# Altium footprint library 2.54-华普微电子模块.PcbLib: 59 footprints (part 3 of 4)
Each footprint in its own frame and in the unit in brackets; x right, y up, seen from the top. Pads: shape width x height; smd on the part's side, far side on the other; paste and mask are expansions set on the pad; w line width, h text height; cw(c..) or ccw(c..) is an arc to the next point about the centre after c.
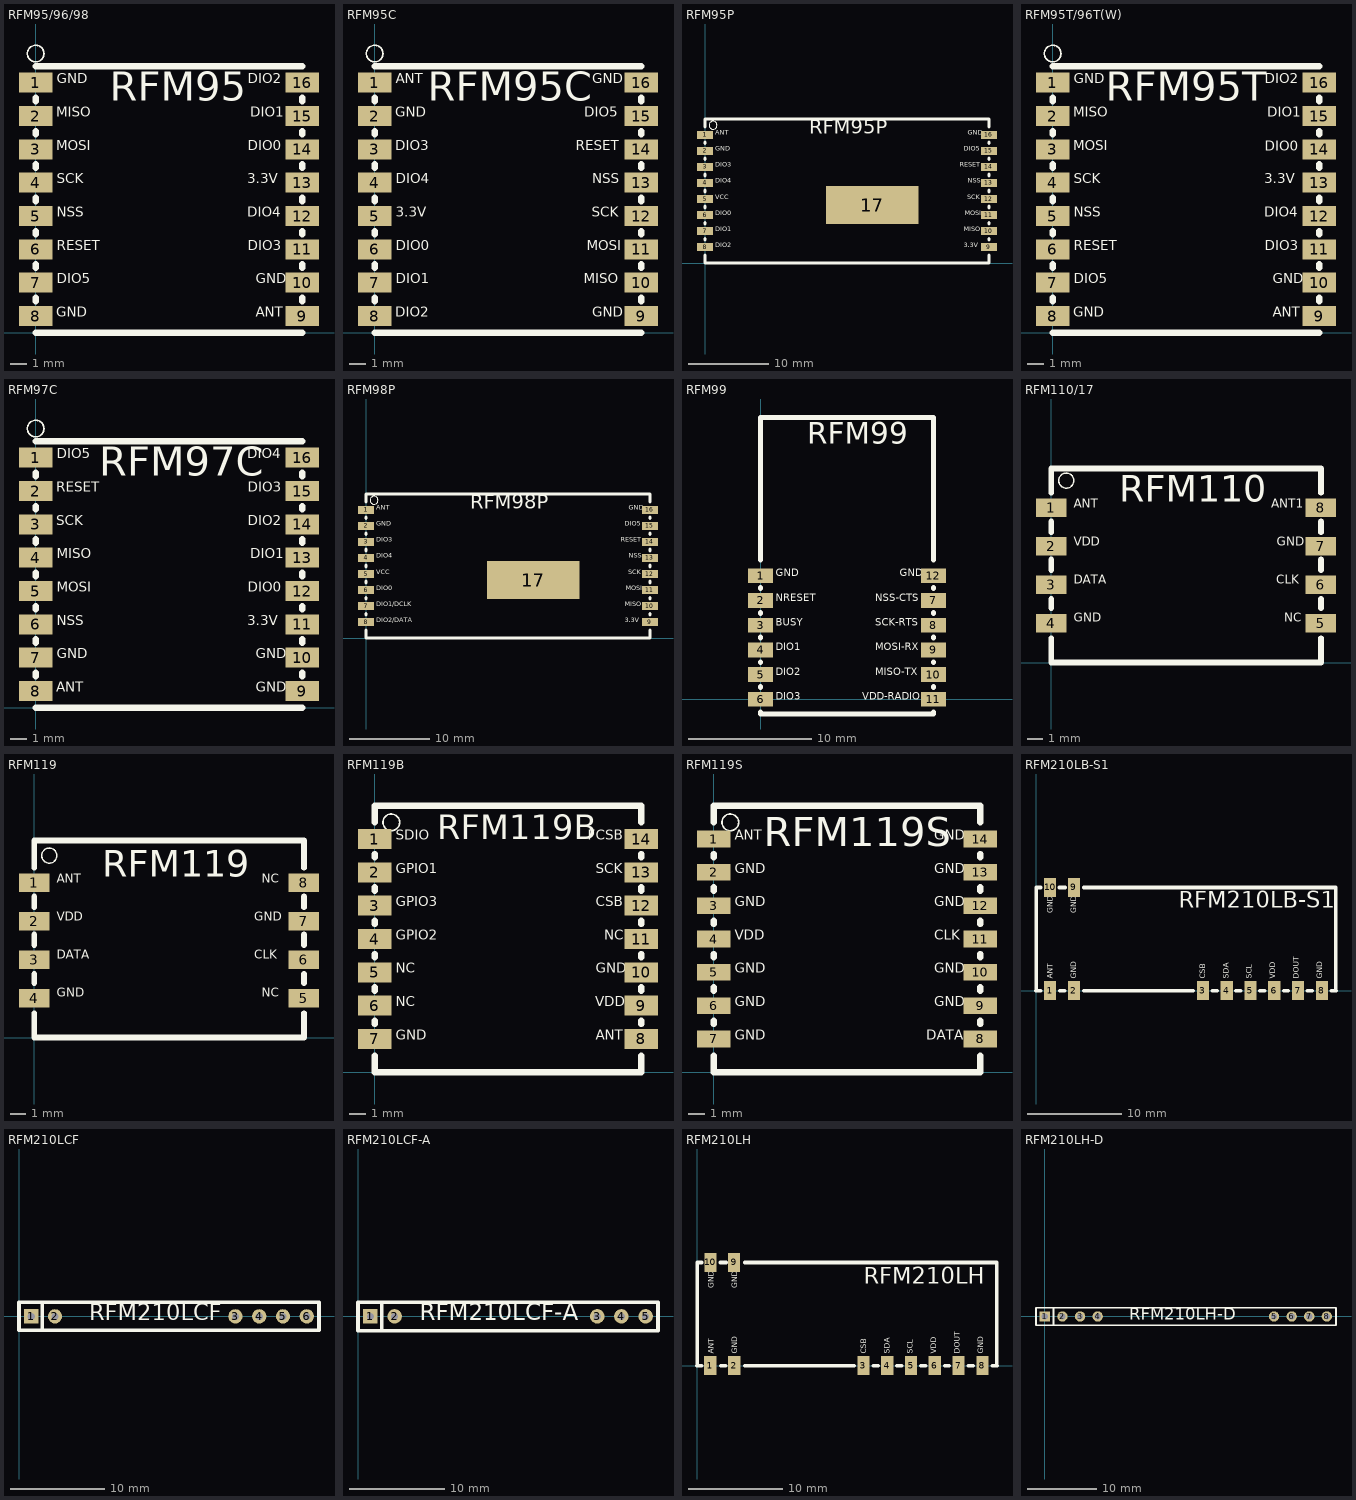
[diagram p2: the footprints below, top view; thin cyan lines are the x and y axes]

## RFM95/96/98 [mm]
pads (16):
  rect 2x1.2 smd: 1(0,15) 2(0,13) 3(0,11) 4(0,9) 5(0,7) 6(0,5) 7(0,3) 8(0,1) 9(16,1) 10(16,3) 11(16,5) 12(16,7) 13(16,9) 14(16,11) 15(16,13) 16(16,15)
Top Overlay:
  circle w0.1: c0,16.75 r0.5
  lines w0.381: 0,0 16,0 ; 0,1.9 0,2.1 ; 0,3.9 0,4.1 ; 0,5.9 0,6.1 ; 0,7.9 0,8.1 ; 0,9.9 0,10.1 ; 0,11.9 0,12.1 ; 0,13.9 0,14.1 ; 0,16 16,16 ; 16,1.9 16,2.1 ; 16,3.9 16,4.1 ; 16,5.9 16,6.1 ; 16,7.9 16,8.1 ; 16,9.9 16,10.1 ; 16,11.9 16,12.1 ; 16,13.9 16,14.1
  text "RFM95" at 4.445,13.335 h3
  text "GND" at 1.25,14.75 h1
  text "MISO" at 1.249,12.75 h1
  text "MOSI" at 1.249,10.75 h1
  text "SCK" at 1.25,8.75 h1
  text "GND" at 1.249,0.75 h1
  text "DIO5" at 1.25,2.75 h1
  text "RESET" at 1.25,4.75 h1
  text "NSS" at 1.25,6.75 h1
  text "3.3V" at 12.7,8.75 h1
  text "DIO0" at 12.731,10.75 h1
  text "DIO1" at 12.883,12.75 h1
  text "DIO2" at 12.739,14.75 h1
  text "DIO4" at 12.7,6.75 h1
  text "DIO3" at 12.739,4.75 h1
  text "GND" at 13.215,2.75 h1
  text "ANT" at 13.204,0.75 h1

## RFM95C [mm]
pads (16):
  rect 2x1.2 smd: 1(0,15) 2(0,13) 3(0,11) 4(0,9) 5(0,7) 6(0,5) 7(0,3) 8(0,1) 9(16,1) 10(16,3) 11(16,5) 12(16,7) 13(16,9) 14(16,11) 15(16,13) 16(16,15)
Top Overlay:
  circle w0.1: c0,16.75 r0.5
  lines w0.381: 0,0 16,0 ; 0,1.9 0,2.1 ; 0,3.9 0,4.1 ; 0,5.9 0,6.1 ; 0,7.9 0,8.1 ; 0,9.9 0,10.1 ; 0,11.9 0,12.1 ; 0,13.9 0,14.1 ; 0,16 16,16 ; 16,1.9 16,2.1 ; 16,3.9 16,4.1 ; 16,5.9 16,6.1 ; 16,7.9 16,8.1 ; 16,9.9 16,10.1 ; 16,11.9 16,12.1 ; 16,13.9 16,14.1
  text "GND" at 13.044,0.75 h1
  text "MISO" at 12.541,2.75 h1
  text "MOSI" at 12.712,4.75 h1
  text "SCK" at 13.025,6.75 h1
  text "GND" at 13.044,14.75 h1
  text "DIO5" at 12.566,12.75 h1
  text "RESET" at 12.065,10.75 h1
  text "NSS" at 13.052,8.75 h1
  text "3.3V" at 1.25,6.75 h1
  text "DIO0" at 1.25,4.75 h1
  text "DIO1" at 1.25,2.75 h1
  text "DIO2" at 1.249,0.75 h1
  text "DIO4" at 1.25,8.75 h1
  text "DIO3" at 1.249,10.75 h1
  text "GND" at 1.249,12.75 h1
  text "ANT" at 1.25,14.75 h1
  text "RFM95C" at 3.175,13.335 h3

## RFM95P [mm]
pads (17):
  rect 2x1 smd: 1(0,16) 2(0,14) 3(0,12) 4(0,10) 5(0,8) 6(0,6) 7(0,4) 8(0,2) 9(35.4,2) 10(35.4,4) 11(35.4,6) 12(35.4,8) 13(35.4,10) 14(35.4,12) 15(35.4,14) 16(35.4,16)
  rect 11.5x4.7 smd: 17(20.85,7.25)
Top Overlay:
  circle w0.1: c1,17.2 r0.5
  lines w0.381: 0,1 0,0 35.4,0 35.4,1 ; 0,2.9 0,3.1 ; 0,4.9 0,5.1 ; 0,6.9 0,7.1 ; 0,8.9 0,9.1 ; 0,10.9 0,11.1 ; 0,12.9 0,13.1 ; 0,14.9 0,15.1 ; 0,17 0,18 35.4,18 35.4,17 ; 35.4,2.9 35.4,3.1 ; 35.4,4.9 35.4,5.1 ; 35.4,6.9 35.4,7.1 ; 35.4,8.9 35.4,9.1 ; 35.4,10.9 35.4,11.1 ; 35.4,12.9 35.4,13.1 ; 35.4,14.9 35.4,15.1
  text "VCC" at 1.25,7.75 h1
  text "DIO0" at 1.25,5.75 h1
  text "DIO1" at 1.25,3.75 h1
  text "DIO2" at 1.249,1.75 h1
  text "DIO4" at 1.25,9.75 h1
  text "DIO3" at 1.249,11.75 h1
  text "GND" at 1.249,13.75 h1
  text "ANT" at 1.25,15.75 h1
  text "SCK" at 32.709,7.75 h1
  text "MOSI" at 32.396,5.75 h1
  text "MISO" at 32.225,3.75 h1
  text "3.3V" at 32.24,1.75 h1
  text "NSS" at 32.736,9.75 h1
  text "RESET" at 31.749,11.75 h1
  text "DIO5" at 32.25,13.75 h1
  text "GND" at 32.728,15.75 h1
  text "RFM95P" at 13,15.5 h3

## RFM95T/96T(W) [mm]
pads (16):
  rect 2x1.2 smd: 1(0,15) 2(0,13) 3(0,11) 4(0,9) 5(0,7) 6(0,5) 7(0,3) 8(0,1) 9(16,1) 10(16,3) 11(16,5) 12(16,7) 13(16,9) 14(16,11) 15(16,13) 16(16,15)
Top Overlay:
  circle w0.1: c0,16.75 r0.5
  lines w0.381: 0,0 16,0 ; 0,1.9 0,2.1 ; 0,3.9 0,4.1 ; 0,5.9 0,6.1 ; 0,7.9 0,8.1 ; 0,9.9 0,10.1 ; 0,11.9 0,12.1 ; 0,13.9 0,14.1 ; 0,16 16,16 ; 16,1.9 16,2.1 ; 16,3.9 16,4.1 ; 16,5.9 16,6.1 ; 16,7.9 16,8.1 ; 16,9.9 16,10.1 ; 16,11.9 16,12.1 ; 16,13.9 16,14.1
  text "RFM95T" at 3.175,13.335 h3
  text "GND" at 1.25,14.75 h1
  text "MISO" at 1.249,12.75 h1
  text "MOSI" at 1.249,10.75 h1
  text "SCK" at 1.25,8.75 h1
  text "GND" at 1.249,0.75 h1
  text "DIO5" at 1.25,2.75 h1
  text "RESET" at 1.25,4.75 h1
  text "NSS" at 1.25,6.75 h1
  text "3.3V" at 12.7,8.75 h1
  text "DIO0" at 12.731,10.7 h1
  text "DIO1" at 12.883,12.75 h1
  text "DIO2" at 12.739,14.75 h1
  text "DIO4" at 12.7,6.75 h1
  text "DIO3" at 12.739,4.75 h1
  text "GND" at 13.215,2.75 h1
  text "ANT" at 13.204,0.75 h1

## RFM97C [mm]
pads (16):
  rect 2x1.2 smd: 1(0,15) 2(0,13) 3(0,11) 4(0,9) 5(0,7) 6(0,5) 7(0,3) 8(0,1) 9(16,1) 10(16,3) 11(16,5) 12(16,7) 13(16,9) 14(16,11) 15(16,13) 16(16,15)
Top Overlay:
  circle w0.1: c0,16.75 r0.5
  lines w0.381: 0,0 16,0 ; 0,1.9 0,2.1 ; 0,3.9 0,4.1 ; 0,5.9 0,6.1 ; 0,7.9 0,8.1 ; 0,9.9 0,10.1 ; 0,11.9 0,12.1 ; 0,13.9 0,14.1 ; 0,16 16,16 ; 16,1.9 16,2.1 ; 16,3.9 16,4.1 ; 16,5.9 16,6.1 ; 16,7.9 16,8.1 ; 16,9.9 16,10.1 ; 16,11.9 16,12.1 ; 16,13.9 16,14.1
  text "GND" at 13.215,0.75 h1
  text "GND" at 13.215,2.75 h1
  text "3.3V" at 12.7,4.75 h1
  text "DIO0" at 12.731,6.75 h1
  text "DIO4" at 12.7,14.75 h1
  text "DIO3" at 12.739,12.75 h1
  text "DIO2" at 12.739,10.75 h1
  text "DIO1" at 12.883,8.75 h1
  text "MOSI" at 1.25,6.75 h1
  text "NSS" at 1.25,4.75 h1
  text "GND" at 1.25,2.75 h1
  text "ANT" at 1.249,0.75 h1
  text "MISO" at 1.25,8.75 h1
  text "SCK" at 1.249,10.75 h1
  text "RESET" at 1.249,12.75 h1
  text "DIO5" at 1.25,14.75 h1
  text "RFM97C" at 3.81,13.335 h3

## RFM98P [mm]
pads (17):
  rect 2x1 smd: 1(0,16) 2(0,14) 3(0,12) 4(0,10) 5(0,8) 6(0,6) 7(0,4) 8(0,2) 9(35.4,2) 10(35.4,4) 11(35.4,6) 12(35.4,8) 13(35.4,10) 14(35.4,12) 15(35.4,14) 16(35.4,16)
  rect 11.5x4.7 smd: 17(20.85,7.25)
Top Overlay:
  circle w0.1: c1,17.2 r0.5
  lines w0.381: 0,1 0,0 35.4,0 35.4,1 ; 0,2.9 0,3.1 ; 0,4.9 0,5.1 ; 0,6.9 0,7.1 ; 0,8.9 0,9.1 ; 0,10.9 0,11.1 ; 0,12.9 0,13.1 ; 0,14.9 0,15.1 ; 0,17 0,18 35.4,18 35.4,17 ; 35.4,2.9 35.4,3.1 ; 35.4,4.9 35.4,5.1 ; 35.4,6.9 35.4,7.1 ; 35.4,8.9 35.4,9.1 ; 35.4,10.9 35.4,11.1 ; 35.4,12.9 35.4,13.1 ; 35.4,14.9 35.4,15.1
  text "VCC" at 1.25,7.75 h1
  text "DIO0" at 1.25,5.75 h1
  text "DIO1/DCLK" at 1.25,3.75 h1
  text "DIO2/DATA" at 1.249,1.75 h1
  text "DIO4" at 1.25,9.75 h1
  text "DIO3" at 1.249,11.75 h1
  text "GND" at 1.249,13.75 h1
  text "ANT" at 1.25,15.75 h1
  text "SCK" at 32.709,7.75 h1
  text "MOSI" at 32.396,5.75 h1
  text "MISO" at 32.225,3.75 h1
  text "3.3V" at 32.24,1.75 h1
  text "NSS" at 32.736,9.75 h1
  text "RESET" at 31.749,11.75 h1
  text "DIO5" at 32.25,13.75 h1
  text "GND" at 32.728,15.75 h1
  text "RFM98P" at 13,15.5 h3

## RFM99 [mm]
pads (12):
  rect 2x1.2 smd: 1(0,10) 2(0,8) 3(0,6) 4(0,4) 5(0,2) 6(0,0) 7(14,8) 8(14,6) 9(14,4) 10(14,2) 11(14,0) 12(14,10)
Top Overlay:
  lines w0.381: 0,-1 0,-1.19 14,-1.19 14,-1 ; 0,0.95 0,1.05 ; 0,2.95 0,3.05 ; 0,4.95 0,5.05 ; 0,6.95 0,7.05 ; 0,8.95 0,9.05 ; 0,11.25 0,22.81 14,22.81 14,11.25 ; 14,0.95 14,1.05 ; 14,2.95 14,3.05 ; 14,4.95 14,5.05 ; 14,6.95 14,7.05 ; 14,8.95 14,9.05
  text "VDD-RADIO" at 8.25,-0.25 h1
  text "MISO-TX" at 9.268,1.75 h1
  text "MOSI-RX" at 9.268,3.75 h1
  text "SCK-RTS" at 9.284,5.75 h1
  text "NSS-CTS" at 9.287,7.75 h1
  text "GND" at 11.277,9.75 h1
  text "DIO3" at 1.25,-0.25 h1
  text "DIO2" at 1.25,1.75 h1
  text "DIO1" at 1.25,3.75 h1
  text "BUSY" at 1.25,5.75 h1
  text "NRESET" at 1.25,7.75 h1
  text "GND" at 1.25,9.75 h1
  text "RFM99" at 3.8,20.1 h3

## RFM110/17 [mm]
pads (8):
  rect 2x1.2 smd: 1(0,10.21) 2(0,7.67) 3(0,5.13) 4(0,2.59) 5(17.78,2.59) 6(17.78,5.13) 7(17.78,7.67) 8(17.78,10.21)
Top Overlay:
  circle w0.1: c1,12 r0.5
  lines w0.381: 0,1.6 0,0 17.8,0 17.8,1.6 ; 0,3.6 0,4.2 ; 0,6.1 0,6.8 ; 0,8.6 0,9.3 ; 0,11.2 0,12.8 17.8,12.8 17.8,11.2 ; 17.8,3.6 17.8,4.2 ; 17.8,6.1 17.8,6.8 ; 17.8,8.6 17.8,9.3
  text "ANT" at 1.5,10 h1
  text "VDD" at 1.499,7.5 h1
  text "DATA" at 1.499,5 h1
  text "GND" at 1.5,2.5 h1
  text "ANT1" at 14.5,10 h1
  text "GND" at 14.862,7.5 h1
  text "CLK" at 14.843,5 h1
  text "NC" at 15.357,2.5 h1
  text "RFM110" at 4.5,10 h3

## RFM119 [mm]
pads (8):
  rect 2x1.2 smd: 1(0,10.21) 2(0,7.67) 3(0,5.13) 4(0,2.59) 5(17.78,2.59) 6(17.78,5.13) 7(17.78,7.67) 8(17.78,10.21)
Top Overlay:
  circle w0.1: c1,12 r0.5
  lines w0.381: 0,1.6 0,0 17.8,0 17.8,1.6 ; 0,3.6 0,4.2 ; 0,6.1 0,6.8 ; 0,8.6 0,9.3 ; 0,11.2 0,13 17.8,13 17.8,11.2 ; 17.8,3.6 17.8,4.2 ; 17.8,6.1 17.8,6.8 ; 17.8,8.6 17.8,9.3
  text "RFM119" at 4.5,10 h3
  text "NC" at 15.014,2.5 h1
  text "CLK" at 14.5,5 h1
  text "GND" at 14.519,7.5 h1
  text "NC" at 15.014,10 h1
  text "GND" at 1.5,2.5 h1
  text "DATA" at 1.5,5 h1
  text "VDD" at 1.5,7.5 h1
  text "ANT" at 1.5,10 h1

## RFM119B [mm]
pads (14):
  rect 2x1.2 smd: 1(0,14) 2(0,12) 3(0,10) 4(0,8) 5(0,6) 6(0,4) 7(0,2) 8(16,2) 9(16,4) 10(16,6) 11(16,8) 12(16,10) 13(16,12) 14(16,14)
Top Overlay:
  circle w0.1: c1,15 r0.5
  lines w0.381: 0,1 0,0 16,0 16,1 ; 0,2.9 0,3.1 ; 0,4.9 0,5.1 ; 0,6.9 0,7.1 ; 0,8.9 0,9.1 ; 0,10.9 0,11.1 ; 0,12.9 0,13.1 ; 0,15 0,16 16,16 16,15 ; 16,2.9 16,3.1 ; 16,4.9 16,5.1 ; 16,6.9 16,7.1 ; 16,8.9 16,9.1 ; 16,10.9 16,11.1 ; 16,12.9 16,13.1
  text "RFM119B" at 3.75,13.5 h2.5
  text "SDIO" at 1.25,13.75 h1
  text "GPIO1" at 1.25,11.75 h1
  text "GPIO3" at 1.25,9.75 h1
  text "GPIO2" at 1.25,7.75 h1
  text "NC" at 1.25,5.75 h1
  text "NC" at 1.25,3.75 h1
  text "GND" at 1.25,1.75 h1
  text "FCSB" at 12.787,13.75 h1
  text "SCK" at 13.258,11.75 h1
  text "CSB" at 13.274,9.75 h1
  text "NC" at 13.772,7.75 h1
  text "GND" at 13.278,5.75 h1
  text "VDD" at 13.25,3.75 h1
  text "ANT" at 13.267,1.75 h1

## RFM119S [mm]
pads (14):
  rect 2x1 smd: 1(0,14) 2(0,12) 3(0,10) 4(0,8) 5(0,6) 6(0,4) 7(0,2) 8(16,2) 9(16,4) 10(16,6) 11(16,8) 12(16,10) 13(16,12) 14(16,14)
Top Overlay:
  circle w0.1: c1,15 r0.5
  lines w0.381: 0,1 0,0 16,0 16,1 ; 0,2.9 0,3.1 ; 0,4.9 0,5.1 ; 0,6.9 0,7.1 ; 0,8.9 0,9.1 ; 0,10.9 0,11.1 ; 0,12.9 0,13.1 ; 0,15 0,16 16,16 16,15 ; 16,2.9 16,3.1 ; 16,4.9 16,5.1 ; 16,6.9 16,7.1 ; 16,8.9 16,9.1 ; 16,10.9 16,11.1 ; 16,12.9 16,13.1
  text "DATA" at 12.75,1.75 h1
  text "GND" at 13.25,3.75 h1
  text "GND" at 13.25,5.75 h1
  text "CLK" at 13.231,7.75 h1
  text "GND" at 13.25,9.75 h1
  text "GND" at 13.25,11.75 h1
  text "GND" at 13.25,13.75 h1
  text "GND" at 1.25,1.75 h1
  text "GND" at 1.25,3.75 h1
  text "GND" at 1.25,5.75 h1
  text "VDD" at 1.25,7.75 h1
  text "GND" at 1.25,9.75 h1
  text "GND" at 1.25,11.75 h1
  text "ANT" at 1.25,13.75 h1
  text "RFM119S" at 3,13 h3

## RFM210LB-S1 [mm]
pads (10):
  rect 1.3x2 smd: 1(1.5,0) 2(4.04,0) 3(17.8,0) 4(20.34,0) 5(22.88,0) 6(25.42,0) 7(27.96,0) 8(30.5,0) 9(4.04,11.01) 10(1.5,11.01)
Top Overlay:
  lines w0.381: -0.004,0 0.504,0 ; 0.5,0 0,0 0,11 0.5,11 ; 2.5,11 3.1,11 ; 2.54,0 3.048,0 ; 5.08,0 16.764,0 ; 5.1,11 32,11 32,0 ; 18.796,0 19.304,0 ; 21.336,0 21.844,0 ; 23.876,0 24.384,0 ; 26.416,0 26.924,0 ; 28.956,0 29.464,0 ; 31.496,0 32.004,0
  text "GND" at 2,8.25 h1
  text "GND" at 4.5,8.25 h1
  text "GND" at 30.75,1.25 h1
  text "DOUT" at 28.25,1.25 h1
  text "VDD" at 25.75,1.25 h1
  text "SCL" at 23.25,1.25 h1
  text "SDA" at 20.75,1.25 h1
  text "CSB" at 18.25,1.25 h1
  text "GND" at 4.5,1.25 h1
  text "ANT" at 2,1.25 h1
  text "RFM210LB-S1" at 15.25,8.25 h3

## RFM210LCF [mil]
pads (6):
  rect 60x60 hole 30: 1(51.18,0)
  round 60 hole 30: 2(151.18,0) 3(908.66,0) 4(1008.66,0) 5(1108.66,0) 6(1208.66,0)
Top Overlay:
  lines w15: 98.43,-59.06 98.43,59.06 ; 0,-59.06 0,59.06 1259.84,59.06 1259.84,-59.06 0,-59.06
  text "RFM210LCF" at 295.28,-39.37 h118.11

## RFM210LCF-A [mil]
pads (5):
  rect 60x60 hole 30: 1(51.18,0)
  round 60 hole 30: 2(151.18,0) 3(988.98,0) 4(1088.98,0) 5(1188.98,0)
Top Overlay:
  lines w15: 98.43,-59.06 98.43,59.06 ; 0,-59.06 1240.16,-59.06 1240.16,59.06 0,59.06 0,-59.06
  text "RFM210LCF-A" at 255.91,-39.37 h118.11

## RFM210LH [mm]
pads (10):
  rect 1.3x2 smd: 1(1.4,0) 2(3.98,0) 3(17.75,0) 4(20.29,0) 5(22.83,0) 6(25.37,0) 7(27.91,0) 8(30.45,0) 9(3.96,11.01) 10(1.42,11.01)
Top Overlay:
  lines w0.381: -0.004,0 0.504,0 ; 0.5,0 0,0 0,11 0.5,11 ; 2.5,11 3.1,11 ; 2.54,0 3.048,0 ; 5.08,0 16.764,0 ; 5.1,11 32,11 32,0 ; 18.796,0 19.304,0 ; 21.336,0 21.844,0 ; 23.876,0 24.384,0 ; 26.416,0 26.924,0 ; 28.956,0 29.464,0 ; 31.496,0 32.004,0
  text "GND" at 2,8.25 h1
  text "GND" at 4.5,8.25 h1
  text "GND" at 30.75,1.25 h1
  text "DOUT" at 28.25,1.25 h1
  text "VDD" at 25.75,1.25 h1
  text "SCL" at 23.25,1.25 h1
  text "SDA" at 20.75,1.25 h1
  text "CSB" at 18.25,1.25 h1
  text "GND" at 4.5,1.25 h1
  text "ANT" at 2,1.25 h1
  text "RFM210LH" at 17.78,8.128 h3

## RFM210LH-D [mm]
pads (8):
  rect 1.5x1.5 hole 0.9: 1(0,0)
  round 1.5 hole 0.9: 2(2.54,0) 3(5.08,0) 4(7.62,0) 5(33.02,0) 6(35.56,0) 7(38.1,0) 8(40.64,0)
Top Overlay:
  lines w0.254: 1.27,-1.27 1.27,1.27 ; -1.27,-1.27 -1.27,1.27 41.95,1.27 41.95,-1.27 -1.27,-1.27
  text "RFM210LH-D" at 12.192,-1.016 h3